# Altium footprint library Caps.PcbLib: 75 footprints (part 2 of 5)
Each footprint in its own frame and in the unit in brackets; x right, y up, seen from the top. Pads: shape width x height; smd on the part's side, far side on the other; paste and mask are expansions set on the pad; w line width, h text height; cw(c..) or ccw(c..) is an arc to the next point about the centre after c.
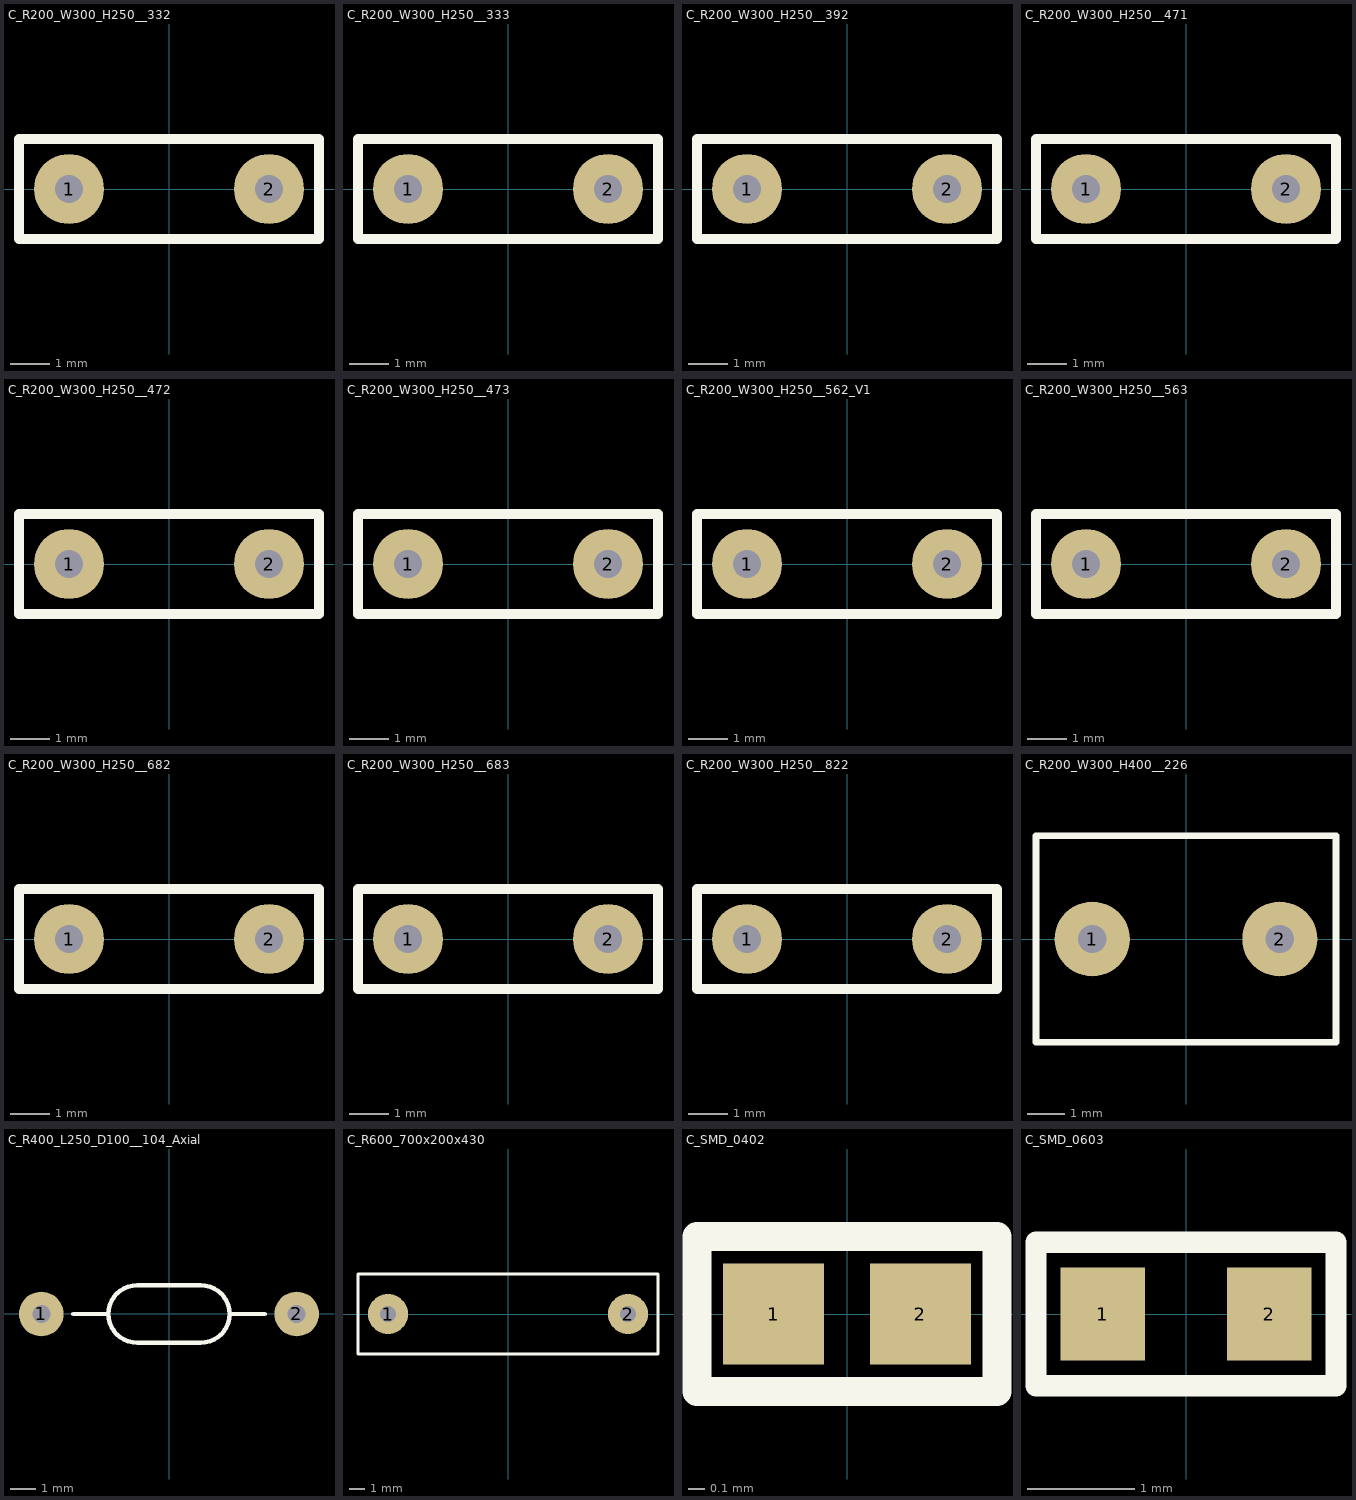
[diagram p1: the footprints below, top view; thin cyan lines are the x and y axes]

## C_R200_W300_H250__332 [mil] "Capacitor 3.3 nF"
height 250
pads (2):
  round 70 hole 28: 1(-100,0) 2(100,0)
Top Overlay:
  lines w10: -150,-50 -150,50 150,50 150,-50 -150,-50
3D body "C_R200_W300_H250__3.3nF.STEP": height 256.01, standoff -78.64, extent -147.64,-50 147.64,52.36

## C_R200_W300_H250__333 [mil] "Capacitor 33 nF"
height 250
pads (2):
  round 70 hole 28: 1(-100,0) 2(100,0)
Top Overlay:
  lines w10: -150,-50 -150,50 150,50 150,-50 -150,-50
3D body "C_R200_W300_H250__33nF.STEP": height 256.01, standoff -78.64, extent -147.64,-50 147.64,52.36

## C_R200_W300_H250__392 [mil] "Capacitor 3.9 nF"
height 250
pads (2):
  round 70 hole 28: 1(-100,0) 2(100,0)
Top Overlay:
  lines w10: -150,-50 150,-50 150,50 -150,50 -150,-50
3D body "C_R200_W300_H250__3.9nF.STEP": height 256.01, standoff -78.64, extent -147.64,-50 147.64,52.36

## C_R200_W300_H250__471 [mil] "Capacitor 470pF"
height 250
pads (2):
  round 70 hole 28: 1(-100,0) 2(100,0)
Top Overlay:
  lines w10: -150,-50 150,-50 150,50 -150,50 -150,-50
3D body "C_R200_W300_H250__470pF.STEP": height 256.01, standoff -78.64, extent -147.64,-50 147.64,52.36

## C_R200_W300_H250__472 [mil] "Capacitor 4.7 nF"
height 250
pads (2):
  round 70 hole 28: 1(-100,0) 2(100,0)
Top Overlay:
  lines w10: -150,-50 150,-50 150,50 -150,50 -150,-50
3D body "C_R200_W300_H250__4.7nF.STEP": height 256.01, standoff -78.64, extent -147.64,-50 147.64,52.36

## C_R200_W300_H250__473 [mil] "Capacitor 47 nF"
height 250
pads (2):
  round 70 hole 28: 1(-100,0) 2(100,0)
Top Overlay:
  lines w10: -150,-50 150,-50 150,50 -150,50 -150,-50
3D body "C_R200_W300_H250__47nF.STEP": height 256.01, standoff -78.64, extent -147.64,-50 147.64,52.36

## C_R200_W300_H250__562_V1 [mil] "Capacitor 5.6 nF"
height 250
pads (2):
  round 70 hole 28: 1(-100,0) 2(100,0)
Top Overlay:
  lines w10: -150,-50 150,-50 150,50 -150,50 -150,-50
3D body "C_R200_W300_H250__5.6nF.STEP": height 256.01, standoff -78.64, extent -147.64,-50 147.64,52.36

## C_R200_W300_H250__563 [mil] "Capacitor 56 nF"
height 250
pads (2):
  round 70 hole 28: 1(-100,0) 2(100,0)
Top Overlay:
  lines w10: -150,-50 -150,50 150,50 150,-50 -150,-50
3D body "C_R200_W300_H250__56nF.STEP": height 256.01, standoff -78.64, extent -147.64,-50 147.64,52.36

## C_R200_W300_H250__682 [mil] "Capacitor  8.2 nF"
height 250
pads (2):
  round 70 hole 28: 1(-100,0) 2(100,0)
Top Overlay:
  lines w10: -150,-50 -150,50 150,50 150,-50 -150,-50
3D body "C_R200_W300_H250__6.8nF.STEP": height 256.01, standoff -78.64, extent -147.64,-50 147.64,52.36

## C_R200_W300_H250__683 [mil] "Capacitor 68 nF"
height 250
pads (2):
  round 70 hole 28: 1(-100,0) 2(100,0)
Top Overlay:
  lines w10: -150,-50 -150,50 150,50 150,-50 -150,-50
3D body "C_R200_W300_H250__68nF.STEP": height 256.01, standoff -78.64, extent -147.64,-50 147.64,52.36

## C_R200_W300_H250__822 [mil] "Capacitor 8.2 nF"
height 250
pads (2):
  round 70 hole 28: 1(-100,0) 2(100,0)
Top Overlay:
  lines w10: -150,-50 150,-50 150,50 -150,50 -150,-50
3D body "C_R200_W300_H250__8.2nF.STEP": height 256.01, standoff -78.64, extent -147.64,-50 147.64,52.36

## C_R200_W300_H400__226 [mil] "Capacitor 2u2/63v"
height 400
pads (2):
  round 80 hole 30: 1(-100,0) 2(100,0)
Top Overlay:
  lines w7: -160,-110 -160,110 160,110 160,-110 -160,-110

## C_R400_L250_D100__104_Axial [mil] "Capacitor Axial 100 nF"
height 100
pads (2):
  round 70 hole 28: 1(-200,0) 2(200,0)
Top Overlay:
  lines w7: -150,0 -100,0 ; 100,0 150,0 ; -50,-45 cw(c-50,0) -50,45 50,45 cw(c50,0) 50,-45 -50,-45
3D body "C_R400_L250_D100_u10_Axial.STEP": height 97.24, standoff -87.8, extent -209.69,-47.49 210,47

## C_R600_700x200x430 [mm] "X2 - 310V"
height 11.43
pads (2):
  round 2.54 hole 1: 1(-7.62,0) 2(7.62,0)
Top Overlay:
  lines w0.203: -9.525,-2.54 -9.525,2.54 9.525,2.54 9.525,-2.54 -9.525,-2.54

## C_SMD_0402 [mm] "Metric Size - 1005"
height 0.3
pads (2):
  rect 0.62x0.62 smd mask+0.051: 1(-0.45,0) 2(0.45,0)
Top Overlay:
  lines w0.178: -0.921,-0.476 0.921,-0.476 0.921,0.476 -0.921,0.476 -0.921,-0.476
3D body "Cap_SMD_0402.SLDPRT": height 0.25, standoff 0, extent -0.5,-0.25 0.5,0.25

## C_SMD_0603 [mil] "Metric Size - 1608"
height 39.37
pads (2):
  rect 31x34 smd: 1(-30.5,0) 2(30.5,0)
Top Overlay:
  lines w7.87: -55,-26.25 -55,26.25 55,26.25 55,-26.25 -55,-26.25
3D body "Cap_SMD_0603.SLDPRT": height 19.68, standoff 0, extent -30,-15 30,15